# Altium footprint library IFAT6.PcbLib: 65 footprints (part 1 of 5)
Each footprint in its own frame and in the unit in brackets; x right, y up, seen from the top. Pads: shape width x height; smd on the part's side, far side on the other; paste and mask are expansions set on the pad; w line width, h text height; cw(c..) or ccw(c..) is an arc to the next point about the centre after c.
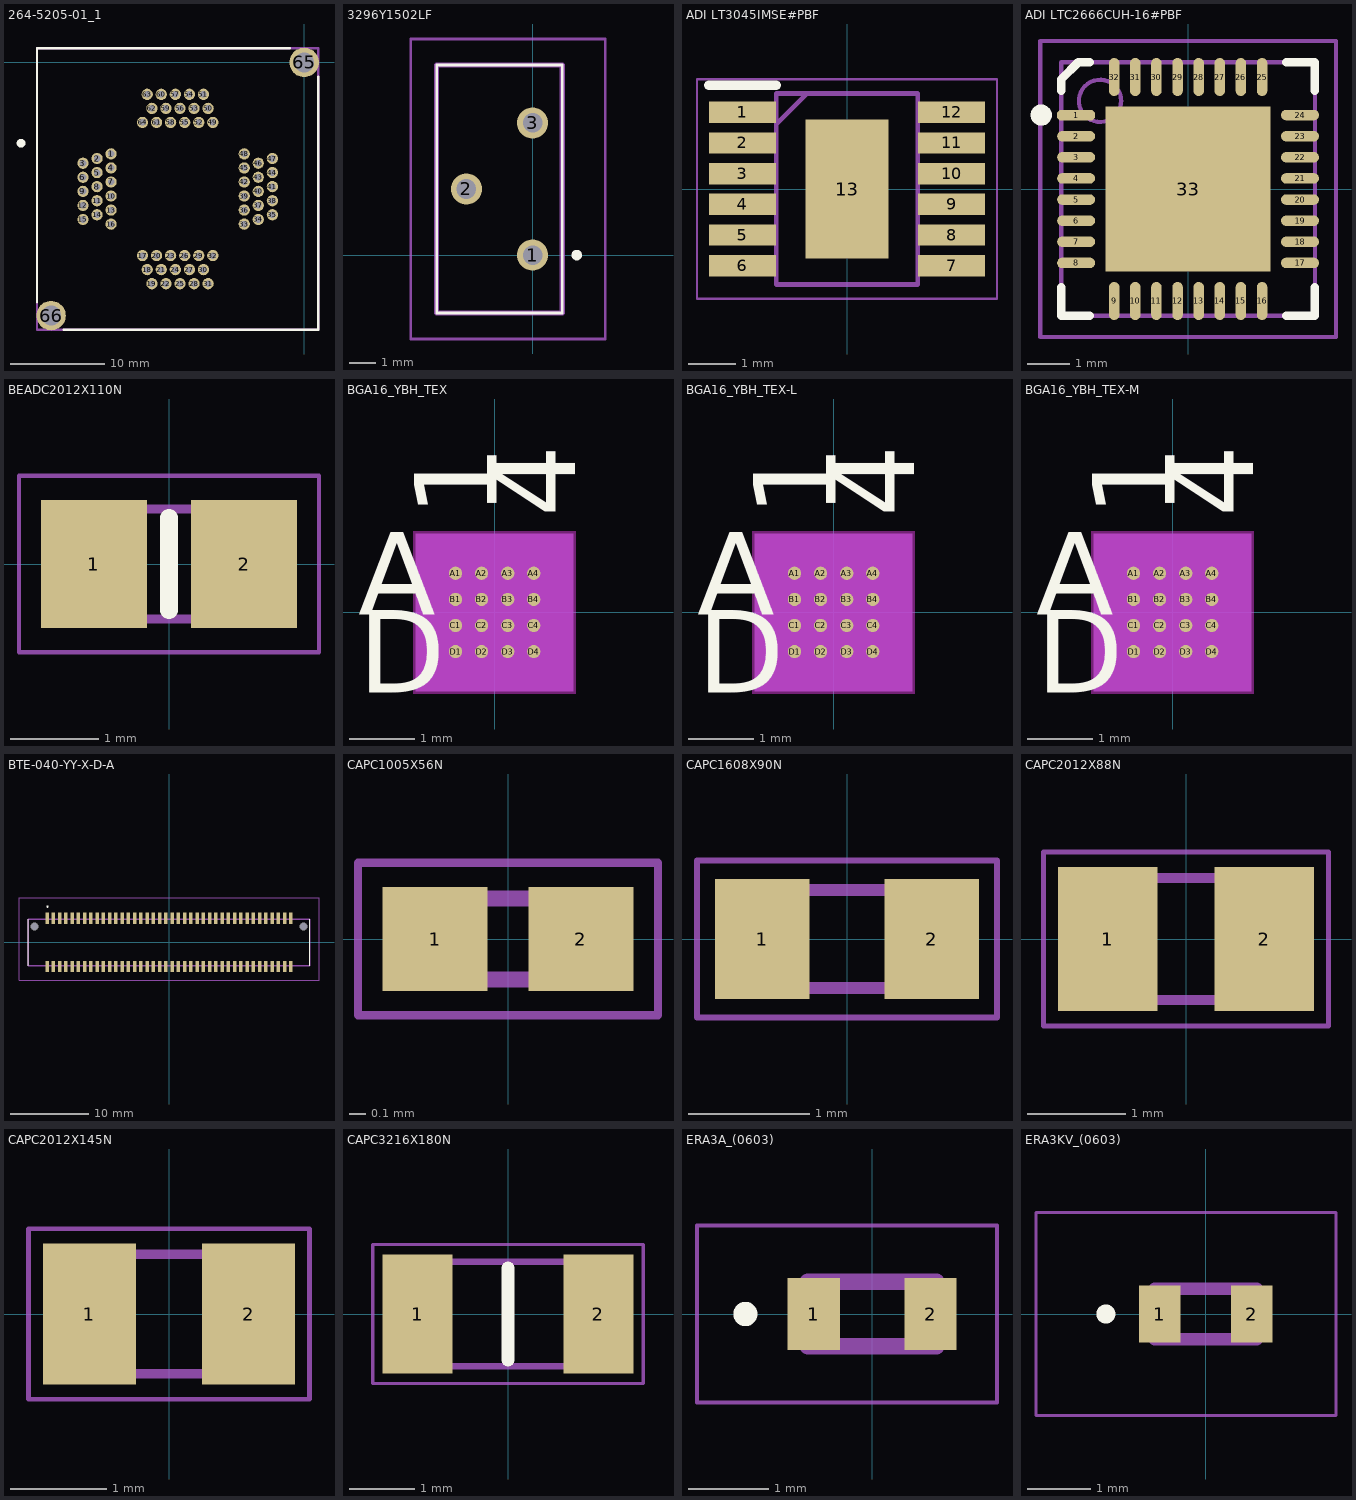
[diagram p0: the footprints below, top view; thin cyan lines are the x and y axes]

## 264-5205-01_1 [mm]
pads (66):
  round 1.2 hole 0.7: 1(-20.6,-9.75) 2(-22.1,-10.25) 3(-23.6,-10.75) 4(-20.6,-11.25) 5(-22.1,-11.75) 6(-23.6,-12.25) 7(-20.6,-12.75) 8(-22.1,-13.25) 9(-23.6,-13.75) 10(-20.6,-14.25) 11(-22.1,-14.75) 12(-23.6,-15.25) 13(-20.6,-15.75) 14(-22.1,-16.25) 15(-23.6,-16.75) 16(-20.6,-17.25) 17(-17.25,-20.6) 18(-16.75,-22.1) 19(-16.25,-23.6) 20(-15.75,-20.6) 21(-15.25,-22.1) 22(-14.75,-23.6) 23(-14.25,-20.6) 24(-13.75,-22.1) 25(-13.25,-23.6) 26(-12.75,-20.6) 27(-12.25,-22.1) 28(-11.75,-23.6) 29(-11.25,-20.6) 30(-10.75,-22.1) 31(-10.25,-23.6) 32(-9.75,-20.6) 33(-6.4,-17.25) 34(-4.9,-16.75) 35(-3.4,-16.25) 36(-6.4,-15.75) 37(-4.9,-15.25) 38(-3.4,-14.75) 39(-6.4,-14.25) 40(-4.9,-13.75) 41(-3.4,-13.25) 42(-6.4,-12.75) 43(-4.9,-12.25) 44(-3.4,-11.75) 45(-6.4,-11.25) 46(-4.9,-10.75) 47(-3.4,-10.25) 48(-6.4,-9.75) 49(-9.75,-6.4) 50(-10.25,-4.9) 51(-10.75,-3.4) 52(-11.25,-6.4) 53(-11.75,-4.9) 54(-12.25,-3.4) 55(-12.75,-6.4) 56(-13.25,-4.9) 57(-13.75,-3.4) 58(-14.25,-6.4) 59(-14.75,-4.9) 60(-15.25,-3.4) 61(-15.75,-6.4) 62(-16.25,-4.9) 63(-16.75,-3.4) 64(-17.25,-6.4)
  round 3.15 hole 2.1: 65(0,0) 66(-27,-27)
Top Overlay:
  circle w0.5: c-30.205,-8.618 r0.219
  lines w0.254: -28.5,-25.584 -28.5,1.5 -1.512,1.5 ; -25.666,-28.5 1.5,-28.5 1.5,-1.5
Mechanical 13:
  lines w0.254: -28.5,-28.5 -28.5,1.5 1.5,1.5 1.5,-28.5 -28.5,-28.5

## 3296Y1502LF [mm]
pads (3):
  round 1.2 hole 0.75: 1(0,0) 2(-2.54,2.54) 3(0,5.08)
Top Overlay:
  lines w0.1: -3.685,-2.225 -3.685,7.305 1.145,7.305 1.145,-2.225 -3.685,-2.225
  lines w0.2: 1.7,-0.1 cw(c1.7,0) 1.7,0.1 cw(c1.7,0) 1.7,-0.1
Mechanical 13:
  lines w0.2: -3.685,-2.225 -3.685,7.305 1.145,7.305 1.145,-2.225 -3.685,-2.225
Mechanical 15:
  lines w0.1: -4.685,-3.225 -4.685,8.305 2.8,8.305 2.8,-3.225 -4.685,-3.225
3D body "3296Y-1-253LF.stp": height 10.13, standoff -5, extent -3.685,-2.225 1.145,7.305

## ADI LT3045IMSE#PBF [mm] "IC REG LINEAR 0V 500MA 12MSOP"
pads (13):
  rect 1.425x0.45 smd: 1(-2.212,1.625) 2(-2.212,0.975) 3(-2.212,0.325) 4(-2.212,-0.325) 5(-2.212,-0.975) 6(-2.212,-1.625) 7(2.212,-1.625) 8(2.212,-0.975) 9(2.212,-0.325) 10(2.212,0.325) 11(2.212,0.975) 12(2.212,1.625)
  rect 1.753x2.947 smd: 13(0,0)
Top Overlay:
  lines w0.2: -2.925,2.2 -1.5,2.2
Mechanical 13:
  lines w0.1: -1.5,1.37 -0.85,2.02 ; -1.5,-2.02 -1.5,2.02 1.5,2.02 1.5,-2.02 -1.5,-2.02
Mechanical 15:
  lines w0.05: -3.175,-2.32 -3.175,2.32 3.175,2.32 3.175,-2.32 -3.175,-2.32
3D body "LT3045IMSE#TRPBF.stp": height 1.1, standoff 0, extent -2.45,-2.02 2.45,2.02

## ADI LTC2666CUH-16#PBF [mm] "IC DAC 16BIT V-OUT 32QFN"
height 0.8
pads (33):
  oct 0.9x0.25 smd: 1(-2.65,1.75)
  oval 0.9x0.25 smd: 2(-2.65,1.25) 3(-2.65,0.75) 4(-2.65,0.25) 5(-2.65,-0.25) 6(-2.65,-0.75) 7(-2.65,-1.25) 8(-2.65,-1.75) 17(2.65,-1.75) 18(2.65,-1.25) 19(2.65,-0.75) 20(2.65,-0.25) 21(2.65,0.25) 22(2.65,0.75) 23(2.65,1.25) 24(2.65,1.75)
  oval 0.25x0.9 smd: 9(-1.75,-2.65) 10(-1.25,-2.65) 11(-0.75,-2.65) 12(-0.25,-2.65) 13(0.25,-2.65) 14(0.75,-2.65) 15(1.25,-2.65) 16(1.75,-2.65) 25(1.75,2.65) 26(1.25,2.65) 27(0.75,2.65) 28(0.25,2.65) 29(-0.25,2.65) 30(-0.75,2.65) 31(-1.25,2.65) 32(-1.75,2.65)
  rect 3.9x3.9 smd: 33(0,0)
Top Overlay:
  circle w0.25: c-3.475,1.75 r0.125
  lines w0.2: -3,-2.325 -3,-3 -2.325,-3 ; -3,2.325 -3,2.6 -2.6,3 -2.325,3 ; 2.325,-3 3,-3 3,-2.325 ; 2.325,3 3,3 3,2.325
Mechanical 13:
  circle w0.1: c-2.085,2.085 r0.5
  lines w0.1: -3,-3 -3,3 3,3 3,-3 -3,-3
Mechanical 15:
  lines w0.1: -0.5,0 0.5,0 ; 0,-0.5 0,0.5 ; -3.5,-3.5 -3.5,3.5 3.5,3.5 3.5,-3.5 -3.5,-3.5

## BEADC2012X110N [mm]
pads (2):
  rect 1.2x1.45 smd: 1(-0.85,0) 2(0.85,0)
Top Overlay:
  lines w0.2: 0,-0.525 0,0.525
Mechanical 13:
  lines w0.1: -1,-0.625 -1,0.625 1,0.625 1,-0.625 -1,-0.625
Mechanical 15:
  lines w0.05: -1.7,-1 -1.7,1 1.7,1 1.7,-1 -1.7,-1
3D body "2508056007Y6.stp": height 1.1, standoff 0, extent -1,-0.625 1,0.625

## BGA16_YBH_TEX [mil]
pads (16):
  round 8 smd paste+0 mask+0: A1(-23.62,23.62) A2(-7.88,23.62) A3(7.88,23.62) A4(23.62,23.62) B1(-23.62,7.88) B2(-7.88,7.88) B3(7.88,7.88) B4(23.62,7.88) C1(-23.62,-7.88) C2(-7.88,-7.88) C3(7.88,-7.88) C4(23.62,-7.88) D1(-23.62,-23.62) D2(-7.88,-23.62) D3(7.88,-23.62) D4(23.62,-23.62)
Top Overlay:
  text "4" at 48.62,57.5 h50
  text "1" at 1.38,57.5 h50
  text "D" at -82.5,-48.62 h50
  text "A" at -82.5,-1.38 h50
Bottom Overlay:
  text "4" at -1.38,57.5 h50
  text "1" at -48.62,57.5 h50
  text "D" at -57.5,-48.62 h50
  text "A" at -57.5,-1.38 h50
Keep-Out Layer:
  region: -49,-49 -49,49 49,49 49,-49
Mechanical 5:
  region: 47.5,-47.5 -47.5,-47.5 -47.5,47.5 47.5,47.5
Mechanical 13:
  lines w1: -32.5,24.62 -24.62,32.5 ; -32.5,-32.5 -32.5,32.5 32.5,32.5 32.5,-32.5 -32.5,-32.5
  text "4" at 48.62,57.5 h50
  text "1" at 1.38,57.5 h50
  text "D" at -82.5,-48.62 h50
  text "A" at -82.5,-1.38 h50
Mechanical 15:
  region: 42.5,-42.5 -42.5,-42.5 -42.5,42.5 42.5,42.5
  lines w6: -42.5,-42.5 42.5,-42.5 42.5,42.5 -42.5,42.5 -42.5,-42.5
3D body "BGA16_YBH_TEX.step": height 16.1, standoff 0, extent -32.52,-32.52 32.52,32.52

## BGA16_YBH_TEX-L [mil]
pads (16):
  round 8 smd paste+0 mask+0: A1(-23.62,23.62) A2(-7.88,23.62) A3(7.88,23.62) A4(23.62,23.62) B1(-23.62,7.88) B2(-7.88,7.88) B3(7.88,7.88) B4(23.62,7.88) C1(-23.62,-7.88) C2(-7.88,-7.88) C3(7.88,-7.88) C4(23.62,-7.88) D1(-23.62,-23.62) D2(-7.88,-23.62) D3(7.88,-23.62) D4(23.62,-23.62)
Top Overlay:
  text "4" at 48.62,57.5 h50
  text "1" at 1.38,57.5 h50
  text "D" at -82.5,-48.62 h50
  text "A" at -82.5,-1.38 h50
Bottom Overlay:
  text "4" at -1.38,57.5 h50
  text "1" at -48.62,57.5 h50
  text "D" at -57.5,-48.62 h50
  text "A" at -57.5,-1.38 h50
Keep-Out Layer:
  region: -49,-49 -49,49 49,49 49,-49
Mechanical 5:
  region: 47.5,-47.5 -47.5,-47.5 -47.5,47.5 47.5,47.5
Mechanical 13:
  lines w1: -32.5,24.62 -24.62,32.5 ; -32.5,-32.5 -32.5,32.5 32.5,32.5 32.5,-32.5 -32.5,-32.5
  text "4" at 48.62,57.5 h50
  text "1" at 1.38,57.5 h50
  text "D" at -82.5,-48.62 h50
  text "A" at -82.5,-1.38 h50
Mechanical 15:
  region: 42.5,-42.5 -42.5,-42.5 -42.5,42.5 42.5,42.5
  lines w6: -42.5,-42.5 42.5,-42.5 42.5,42.5 -42.5,42.5 -42.5,-42.5
3D body "BGA16_YBH_TEX.step": height 16.1, standoff 0, extent -32.52,-32.52 32.52,32.52

## BGA16_YBH_TEX-M [mil]
pads (16):
  round 8 smd paste+0 mask+0: A1(-23.62,23.62) A2(-7.88,23.62) A3(7.88,23.62) A4(23.62,23.62) B1(-23.62,7.88) B2(-7.88,7.88) B3(7.88,7.88) B4(23.62,7.88) C1(-23.62,-7.88) C2(-7.88,-7.88) C3(7.88,-7.88) C4(23.62,-7.88) D1(-23.62,-23.62) D2(-7.88,-23.62) D3(7.88,-23.62) D4(23.62,-23.62)
Top Overlay:
  text "4" at 48.62,57.5 h50
  text "1" at 1.38,57.5 h50
  text "D" at -82.5,-48.62 h50
  text "A" at -82.5,-1.38 h50
Bottom Overlay:
  text "4" at -1.38,57.5 h50
  text "1" at -48.62,57.5 h50
  text "D" at -57.5,-48.62 h50
  text "A" at -57.5,-1.38 h50
Keep-Out Layer:
  region: -49,-49 -49,49 49,49 49,-49
Mechanical 5:
  region: 47.5,-47.5 -47.5,-47.5 -47.5,47.5 47.5,47.5
Mechanical 13:
  lines w1: -32.5,24.62 -24.62,32.5 ; -32.5,-32.5 -32.5,32.5 32.5,32.5 32.5,-32.5 -32.5,-32.5
  text "4" at 48.62,57.5 h50
  text "1" at 1.38,57.5 h50
  text "D" at -82.5,-48.62 h50
  text "A" at -82.5,-1.38 h50
Mechanical 15:
  region: 42.5,-42.5 -42.5,-42.5 -42.5,42.5 42.5,42.5
  lines w6: -42.5,-42.5 42.5,-42.5 42.5,42.5 -42.5,42.5 -42.5,-42.5
3D body "BGA16_YBH_TEX.step": height 16.1, standoff 0, extent -32.52,-32.52 32.52,32.52

## BTE-040-YY-X-D-A [mm]
pads (82):
  rect 0.457x1.448 smd: 1(-15.6,3.086) 2(-15.6,-3.086) 3(-14.8,3.086) 4(-14.8,-3.086) 5(-14,3.086) 6(-14,-3.086) 7(-13.2,3.086) 8(-13.2,-3.086) 9(-12.4,3.086) 10(-12.4,-3.086) 11(-11.6,3.086) 12(-11.6,-3.086) 13(-10.8,3.086) 14(-10.8,-3.086) 15(-10,3.086) 16(-10,-3.086) 17(-9.2,3.086) 18(-9.2,-3.086) 19(-8.4,3.086) 20(-8.4,-3.086) 21(-7.6,3.086) 22(-7.6,-3.086) 23(-6.8,3.086) 24(-6.8,-3.086) 25(-6,3.086) 26(-6,-3.086) 27(-5.2,3.086) 28(-5.2,-3.086) 29(-4.4,3.086) 30(-4.4,-3.086) 31(-3.6,3.086) 32(-3.6,-3.086) 33(-2.8,3.086) 34(-2.8,-3.086) 35(-2,3.086) 36(-2,-3.086) 37(-1.2,3.086) 38(-1.2,-3.086) 39(-0.4,3.086) 40(-0.4,-3.086) 41(0.4,3.086) 42(0.4,-3.086) 43(1.2,3.086) 44(1.2,-3.086) 45(2,3.086) 46(2,-3.086) 47(2.8,3.086) 48(2.8,-3.086) 49(3.6,3.086) 50(3.6,-3.086) 51(4.4,3.086) 52(4.4,-3.086) 53(5.2,3.086) 54(5.2,-3.086) 55(6,3.086) 56(6,-3.086) 57(6.8,3.086) 58(6.8,-3.086) 59(7.6,3.086) 60(7.6,-3.086) 61(8.4,3.086) 62(8.4,-3.086) 63(9.2,3.086) 64(9.2,-3.086) 65(10,3.086) 66(10,-3.086) 67(10.8,3.086) 68(10.8,-3.086) 69(11.6,3.086) 70(11.6,-3.086) 71(12.4,3.086) 72(12.4,-3.086) 73(13.2,3.086) 74(13.2,-3.086) 75(14,3.086) 76(14,-3.086) 77(14.8,3.086) 78(14.8,-3.086) 79(15.6,3.086) 80(15.6,-3.086)
  round 0.508 hole 1.016 unplated: 81(-17.239,2.032) 82(17.239,2.032)
Top Overlay:
  circle w0.2: c-15.55,4.586 r0.05
  lines w0.1: -18,-2.985 -18,2.985 ; 18,-2.985 18,2.985
Mechanical 13:
  lines w0.2: -18,-2.985 -18,2.985 18,2.985 18,-2.985 -18,-2.985
Mechanical 15:
  lines w0.05: -19.2,-4.81 -19.2,5.686 19.2,5.686 19.2,-4.81 -19.2,-4.81
3D body "BTE-040-01-F-D-A.stp": height 4.37, standoff -1.7, extent -18,-3.764 18,3.764

## CAPC1005X56N [mm]
pads (2):
  rect 0.65x0.64 smd: 1(-0.45,0) 2(0.45,0)
Mechanical 13:
  lines w0.1: -0.5,-0.25 -0.5,0.25 0.5,0.25 0.5,-0.25 -0.5,-0.25
Mechanical 15:
  lines w0.05: -0.925,-0.47 -0.925,0.47 0.925,0.47 0.925,-0.47 -0.925,-0.47
3D body "04025A470JAT2A.stp": height 0.56, standoff 0, extent -0.5,-0.25 0.5,0.25

## CAPC1608X90N [mm]
pads (2):
  rect 0.78x0.99 smd: 1(-0.7,0) 2(0.7,0)
Mechanical 13:
  lines w0.1: -0.8,-0.405 0.8,-0.405 0.8,0.405 -0.8,0.405 -0.8,-0.405
Mechanical 15:
  lines w0.05: -1.24,-0.65 1.24,-0.65 1.24,0.65 -1.24,0.65 -1.24,-0.65
3D body "06035A101FAT2A.stp": height 0.9, standoff 0, extent -0.8,-0.405 0.8,0.405

## CAPC2012X88N [mm]
pads (2):
  rect 1.02x1.47 smd: 1(-0.8,0) 2(0.8,0)
Mechanical 13:
  lines w0.1: -1,-0.625 -1,0.625 1,0.625 1,-0.625 -1,-0.625
Mechanical 15:
  lines w0.05: -1.46,-0.89 -1.46,0.89 1.46,0.89 1.46,-0.89 -1.46,-0.89
3D body "C0805C100J5GACTU.stp": height 0.88, standoff 0, extent -1,-0.625 1,0.625

## CAPC2012X145N [mm]
pads (2):
  rect 0.97x1.47 smd: 1(-0.83,0) 2(0.83,0)
Mechanical 13:
  lines w0.1: -1,-0.625 -1,0.625 1,0.625 1,-0.625 -1,-0.625
Mechanical 15:
  lines w0.05: -1.465,-0.89 -1.465,0.89 1.465,0.89 1.465,-0.89 -1.465,-0.89
3D body "GRM21BR60J107ME15.stp": height 1.45, standoff 0, extent -1,-0.625 1,0.625

## CAPC3216X180N [mm]
pads (2):
  rect 1.07x1.82 smd: 1(-1.38,0) 2(1.38,0)
Top Overlay:
  lines w0.2: 0,-0.7 0,0.7
Mechanical 13:
  lines w0.1: -1.6,-0.8 -1.6,0.8 1.6,0.8 1.6,-0.8 -1.6,-0.8
Mechanical 15:
  lines w0.05: -2.065,-1.06 -2.065,1.06 2.065,1.06 2.065,-1.06 -2.065,-1.06
3D body "GRM31CR60J107ME39L.stp": height 1.8, standoff 0, extent -1.6,-0.8 1.6,0.8

## ERA3A_(0603) [mm]
pads (2):
  rect 0.65x0.9 smd: 1(-0.725,0) 2(0.725,0)
Top Overlay:
  circle w0.2: c-1.575,0 r0.05
Mechanical 13:
  lines w0.2: -0.8,-0.4 -0.8,0.4 0.8,0.4 0.8,-0.4 -0.8,-0.4
Mechanical 15:
  lines w0.05: -2.175,-1.1 -2.175,1.1 1.55,1.1 1.55,-1.1 -2.175,-1.1
3D body "ERA-3ARB203V.stp": height 0.45, standoff 0, extent -0.8,-0.4 0.8,0.4

## ERA3KV_(0603) [mm]
pads (2):
  rect 0.65x0.9 smd: 1(-0.725,0) 2(0.725,0)
Top Overlay:
  circle w0.2: c-1.575,0 r0.05
Mechanical 13:
  lines w0.2: -0.8,-0.4 -0.8,0.4 0.8,0.4 0.8,-0.4 -0.8,-0.4
Mechanical 15:
  lines w0.05: -2.675,-1.6 -2.675,1.6 2.05,1.6 2.05,-1.6 -2.675,-1.6
3D body "ERA-3VRW1802V.stp": height 0.46, standoff 0, extent -0.8,-0.4 0.8,0.4